# Altium footprint library My Footprint.PcbLib: 268 footprints (part 1 of 17)
Each footprint in its own frame and in the unit in brackets; x right, y up, seen from the top. Pads: shape width x height; smd on the part's side, far side on the other; paste and mask are expansions set on the pad; w line width, h text height; cw(c..) or ccw(c..) is an arc to the next point about the centre after c.
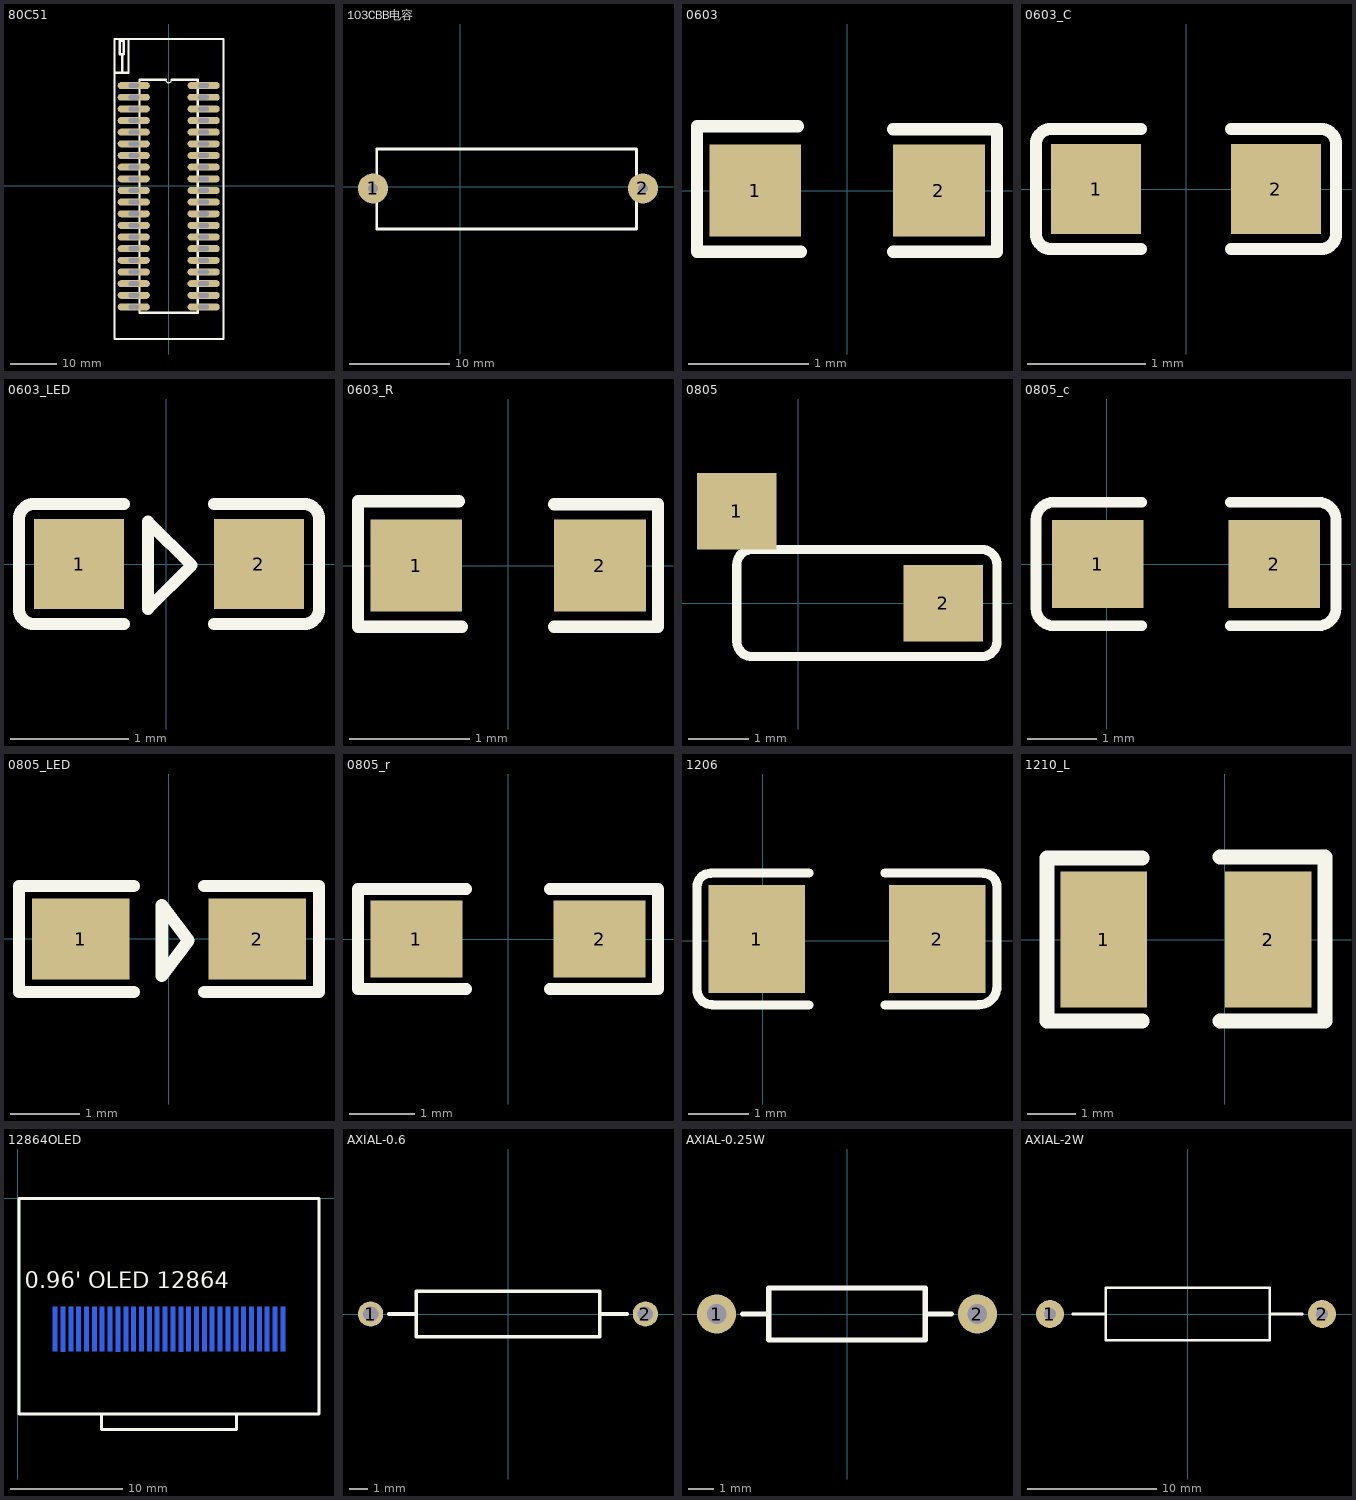
[diagram p0: the footprints below, top view; thin cyan lines are the x and y axes]

## 80C51 [mm] "MCU_P40"
pads (40):
  oval 7x1.524 hole 1 slot 2.286 at 0 deg: 1(-7.609,21.848) 2(-7.609,19.308) 3(-7.609,16.768) 4(-7.609,14.228) 5(-7.609,11.688) 6(-7.609,9.148) 7(-7.609,6.608) 8(-7.609,4.068) 9(-7.609,1.528) 10(-7.609,-1.012) 11(-7.609,-3.552) 12(-7.609,-6.092) 13(-7.609,-8.632) 14(-7.609,-11.172) 15(-7.609,-13.712) 16(-7.609,-16.252) 17(-7.609,-18.792) 18(-7.609,-21.332) 19(-7.609,-23.872) 20(-7.609,-26.412) 21(7.631,-26.412) 22(7.631,-23.872) 23(7.631,-21.332) 24(7.631,-18.792) 25(7.631,-16.252) 26(7.631,-13.712) 27(7.631,-11.172) 28(7.631,-8.632) 29(7.631,-6.092) 30(7.631,-3.552) 31(7.631,-1.012) 32(7.631,1.528) 33(7.631,4.068) 34(7.631,6.608) 35(7.631,9.148) 36(7.631,11.688) 37(7.631,14.228) 38(7.631,16.768) 39(7.631,19.308)
  oval 7x1.524 hole 1.016 slot 2.286 at 0 deg: 40(7.631,21.848)
Top Overlay:
  lines w0.254: -0.624,23.118 ccw(c0.011,23.118) 0.646,23.118
  lines w0.5: -11.8,21.848 -11.8,32.008 11.949,32.008 11.949,21.848 11.949,-33.397 -9.006,-33.397 ; -11.8,22.61 -11.8,-33.397 -8.879,-33.397 ; -11.673,24.642 -8.752,24.642 -8.752,26.801 -8.752,32.008 ; -10.149,24.642 -10.149,28.706 ; -9.768,28.833 -9.768,28.706 ; -0.624,23.118 -6.339,23.118 -6.339,-27.682 6.361,-27.682 6.361,23.118 0.646,23.118 ; -9.768,28.706 -9.768,31.627 -10.657,31.627 -10.657,28.706 -9.768,28.706
3D body "DIP40.STEP": height 17.13, standoff 8.85, extent -7.745,-29.4 7.745,23.05
3D body "ZIF-40.STEP": height 11, standoff -5, extent -12.182,-33.135 11.684,44.057

## 103CBB电容 [mm]
pads (2):
  round 3 hole 1: 1(-8.687,-0.178) 2(18.136,-0.178)
Top Overlay:
  lines w0.254: -8.306,-4.216 -8.306,3.734 17.501,3.734 17.501,-4.216 -8.306,-4.216

## 0603 [mil]
height 23.62
pads (2):
  rect 30x30 smd: 1(-30,0) 2(30,0)
Top Overlay:
  lines w4: -16,21 -49,21 -49,-20 -15,-20 ; 15,-20 49,-20 49,20 15,20
3D body "INDC1608(0603).STEP": height 33.75, standoff 2.25, extent -31.5,-18.4 31.5,19

## 0603_C [mil] "Capacitor"
height 33.46
pads (2):
  rect 30x30 smd: 1(-30,0) 2(30,0)
Top Overlay:
  lines w4: -15,-20 -45,-20 cw(c-45,-15) -50,-15 -50,15 cw(c-45,15) -45,20 -15,20 ; 15,-20 45,-20 ccw(c45,-15) 50,-15 50,15 ccw(c45,15) 45,20 15,20
3D body "Capacitor 0603 SMD.step": height 35.04, standoff -0.39, extent -50.67,-18.4 51.69,20.97

## 0603_LED [mil]
pads (2):
  rect 30x30 smd: 1(-29,0) 2(31,0)
Top Overlay:
  lines w3.94: -6.02,-15 -6.02,14.13 8.54,-0.43 -6.02,-15
  lines w4: -14,-20 -44,-20 cw(c-44,-15) -49,-15 -49,15 cw(c-44,15) -44,20 -14,20 ; 16,-20 46,-20 ccw(c46,-15) 51,-15 51,15 ccw(c46,15) 46,20 16,20
3D body "led0805  green.step": height 43.31, standoff -0.5, extent -40,-25 40,25

## 0603_R [mil]
height 23.62
pads (2):
  rect 30x30 smd: 1(-30,0) 2(30,0)
Top Overlay:
  lines w4: -16,21 -49,21 -49,-20 -15,-20 ; 15,-20 49,-20 49,20 15,20
3D body "R0603.STEP": height 17.72, standoff 0, extent -31.5,-15.75 31.49,15.75

## 0805 [mil]
pads (2):
  rect 52x50 smd: 1(-40,60) 2(95,0)
Top Overlay:
  lines w6: -40,-25 ccw(c-30,-25) -30,-35 70,-35 120,-35 ccw(c120,-25) 130,-25 130,25 ccw(c120,25) 120,35 70,35 -30,35 ccw(c-30,25) -40,25 -40,-25
3D body "CAPC2012(0805).STEP": height 37.4, standoff 0, extent 5.64,-23.62 84.38,23.63

## 0805_c [mil]
pads (2):
  rect 52x50 smd: 1(-5,0) 2(95,0)
Top Overlay:
  lines w6: 20,-35 -30,-35 cw(c-30,-25) -40,-25 -40,25 cw(c-30,25) -30,35 20,35 ; 70,-35 120,-35 ccw(c120,-25) 130,-25 130,25 ccw(c120,25) 120,35 70,35
3D body "Capacitor 0805 SMD.step": height 36.61, standoff -0.39, extent -13.11,-27.56 105,27.56

## 0805_LED [mil]
pads (2):
  rect 55.12x46 smd: 1(-50,0) 2(50,0)
Top Overlay:
  lines w7: -20,-30 -85,-30 -85,30 -20,30 ; 20,-30 85,-30 85,30 20,30 ; -4.02,-20.87 10.98,-0.87 -4.02,19.13 -4.02,-20.87
3D body "led0805  green.step": height 43.31, standoff -0.5, extent -40,-25 40,25

## 0805_r [mil]
pads (2):
  rect 55.12x46 smd: 1(-55,0) 2(55,0)
Top Overlay:
  lines w7: -25,-30 -90,-30 -90,30 -25,30 ; 25,-30 90,-30 90,30 25,30
3D body "R0805.STEP": height 21.65, standoff 0, extent -39.36,-24.8 39.38,24.81

## 1206 [mil]
pads (2):
  rect 62.99x70.87 smd: 1(-4,1) 2(114,1)
Top Overlay:
  lines w5.91: -43,-32 -43,35 ; -34,44 30,44 ; -33,-42 30,-42 ; 80,-42 141,-42 ; 80,44 144,44 ; 153,-30 153,35
  lines w6: -43,-32 ccw(c-33,-32) -33,-42 ; -43,35 cw(c-34,35) -34,44 ; 141,-42 ccw(c141,-30) 153,-30 ; 144,44 cw(c144,35) 153,35
3D body "CAPC3216(1206).STEP": height 37.4, standoff 0, extent -7.99,-31.49 117.99,31.5

## 1210_L [mil]
pads (2):
  rect 70x110 smd: 1(-98,0) 2(35,0)
Top Overlay:
  lines w12: -67,-66 -144,-66 -144,66 -67,66 ; -4,-66 81,-66 81,67 -4,67
3D body "CAPC3225(1210).STEP": height 51.18, standoff 0, extent -97.98,-49.21 28,49.22

## 12864OLED [mm]
pads (30):
  rect 0.4x4 smd far side: 1(3.315,-11.633) 2(4.015,-11.633) 3(4.715,-11.633) 4(5.415,-11.633) 5(6.115,-11.633) 6(6.815,-11.633) 7(7.515,-11.633) 8(8.215,-11.633) 9(8.915,-11.633) 10(9.615,-11.633) 11(10.315,-11.633) 12(11.015,-11.633) 13(11.715,-11.633) 14(12.415,-11.633) 15(13.115,-11.633) 16(13.815,-11.633) 17(14.515,-11.633) 18(15.215,-11.633) 19(15.915,-11.633) 20(16.615,-11.633) 21(17.315,-11.633) 22(18.015,-11.633) 23(18.715,-11.633) 24(19.415,-11.633) 25(20.115,-11.633) 26(20.815,-11.633) 27(21.515,-11.633) 28(22.215,-11.633) 29(22.915,-11.633) 30(23.615,-11.633)
Top Overlay:
  lines w0.254: 7.465,-19.193 7.465,-20.573 19.465,-20.573 19.465,-19.193 ; 0.105,-19.193 26.825,-19.193 26.825,-0.013 0.105,-0.013 0.105,-19.193
  text "0.96' OLED 12864" at 0.625,-8.473 h2.5
Bottom Overlay:
  lines w0.254: 2.985,-11.953 2.465,-11.953 2.465,-16.153 7.465,-18.953 ccw(c7.465,-18.993) 7.425,-18.993 7.425,-20.573 ; 7.465,-20.573 19.425,-20.573 19.425,-18.975 24.465,-16.153 24.465,-11.953 23.945,-11.953

## AXIAL-0.6 [mm] "小型封装的功率电阻"
height 2.54
pads (2):
  round 1.4 hole 0.85: 1(-7.62,0) 2(7.62,0)
Top Overlay:
  lines w0.2: -6.604,0 -5.08,0 ; 5.08,0 6.604,0 ; -5.08,-1.27 5.08,-1.27 5.08,1.27 -5.08,1.27 -5.08,-1.27
3D body "AXIAL0.6.STEP": height 5, standoff -3, extent -8.02,-1.956 8.02,2.044

## AXIAL-0.25W [mil] "0.25W普通电阻"
height 80
pads (2):
  round 60 hole 30: 1(-200,0) 2(200,0)
Top Overlay:
  lines w7.87: -160,0 -120,0 ; 120,0 160,0 ; -120,-40 -120,40 120,40 120,-40 -120,-40
3D body "AXIAL-0.4-0.25W.STEP": height 128.35, standoff -78.74, extent -211.81,-49.61 211.81,49.61

## AXIAL-2W [mil] "1W,2W的功率电阻"
height 160
pads (2):
  round 85 hole 36: 1(-420,0) 2(410,0)
Top Overlay:
  lines w7.87: -350,0 -250,0 ; 250,0 350,0 ; -250,-80 250,-80 250,80 -250,80 -250,-80
3D body "AXIAL_RESISTOR(3W).step": height 326.77, standoff -78.74, extent -437.01,-134.84 437.01,125